# Altium schematic symbol library jlcpcb_2025_04_capacitors_extended_0805.schlib: 3281 symbols (part 16 of 18) (continued)
## NL0805B104M500CPBN
designator C?  Capacitance: 100nF  (hidden comment: *)
Capacitor, Ceramic (MLCC), 100nF, ±20%, 50V, X7R, ±20%, SMD 0805; Manufacturer: HUI JU; Manufacturer Part Number: NL0805B104M500CPBN; Package Size: 0805; JLCPCB Basic Part: No; JLCPCB Part Number: C720961; Supplier 1: LCSC; Category: Capacitors - MLCC; Supplier Part Number 1: C720961; Tolerance: ±20%; Voltage Rating: 50V; Temperature Coefficient: X7R; RoHS: Yes; ComponentLink1Description: Datasheet; ComponentLink1URL: https://wmsc.lcsc.com/wmsc/upload/file/pdf/v2/lcsc/2304140030_HUI-JU-NL0805B104M500CPBN_C720961.pdf; ComponentLink2Description: JLCPCB Part URL; ComponentLink2URL: https://jlcpcb.com/partdetail/C720961; ComponentLink3Description: LCSC Part URL; ComponentLink3URL: https://lcsc.com/product-detail/Multilayer-Ceramic-Capacitors-MLCC---SMD-SMT_HUI-JU-HUI-JU-NL0805B104M500CPBN_C720961.html
footprint CAP-0805 (0805 (2012M) Capacitor)
pins: 1, 2

## NL0805B122K500CPBN
designator C?  Capacitance: 1.2nF  (hidden comment: *)
Capacitor, Ceramic (MLCC), 1.2nF, ±10%, 50V, X7R, ±10%, SMD 0805; Manufacturer: HUI JU; Manufacturer Part Number: NL0805B122K500CPBN; Package Size: 0805; JLCPCB Basic Part: No; JLCPCB Part Number: C2961024; Supplier 1: LCSC; Category: Capacitors - MLCC; Supplier Part Number 1: C2961024; Tolerance: ±10%; Voltage Rating: 50V; Temperature Coefficient: X7R; RoHS: Yes; ComponentLink1Description: Datasheet; ComponentLink1URL: https://wmsc.lcsc.com/wmsc/upload/file/pdf/v2/lcsc/2201141700_HUI-JU-NL0805B122K500CPBN_C2961024.pdf; ComponentLink2Description: JLCPCB Part URL; ComponentLink2URL: https://jlcpcb.com/partdetail/C2961024; ComponentLink3Description: LCSC Part URL; ComponentLink3URL: https://lcsc.com/product-detail/Multilayer-Ceramic-Capacitors-MLCC---SMD-SMT_HUI-JU-HUI-JU-NL0805B122K500CPBN_C2961024.html
footprint CAP-0805 (0805 (2012M) Capacitor)
pins: 1, 2

## NL0805B124K500CEDN
designator C?  Capacitance: 120nF  (hidden comment: *)
Capacitor, Ceramic (MLCC), 120nF, ±10%, 50V, X7R, ±10%, SMD 0805; Manufacturer: HUI JU; Manufacturer Part Number: NL0805B124K500CEDN; Package Size: 0805; JLCPCB Basic Part: No; JLCPCB Part Number: C725799; Supplier 1: LCSC; Category: Capacitors - MLCC; Supplier Part Number 1: C725799; Tolerance: ±10%; Voltage Rating: 50V; Temperature Coefficient: X7R; RoHS: Yes; ComponentLink1Description: Datasheet; ComponentLink1URL: https://wmsc.lcsc.com/wmsc/upload/file/pdf/v2/lcsc/2304140030_HUI-JU-NL0805B124K500CEDN_C725799.pdf; ComponentLink2Description: JLCPCB Part URL; ComponentLink2URL: https://jlcpcb.com/partdetail/C725799; ComponentLink3Description: LCSC Part URL; ComponentLink3URL: https://lcsc.com/product-detail/Multilayer-Ceramic-Capacitors-MLCC---SMD-SMT_HUI-JU-HUI-JU-NL0805B124K500CEDN_C725799.html
footprint CAP-0805 (0805 (2012M) Capacitor)
pins: 1, 2

## NL0805B124K500CPBN
designator C?  Capacitance: 120nF  (hidden comment: *)
Capacitor, Ceramic (MLCC), 120nF, ±10%, 50V, ±10%, SMD 0805; Manufacturer: HUI JU; Manufacturer Part Number: NL0805B124K500CPBN; Package Size: 0805; JLCPCB Basic Part: No; JLCPCB Part Number: C2835176; Supplier 1: LCSC; Category: Capacitors - MLCC; Supplier Part Number 1: C2835176; Tolerance: ±10%; Voltage Rating: 50V; RoHS: Yes; ComponentLink1Description: Datasheet; ComponentLink1URL: https://wmsc.lcsc.com/wmsc/upload/file/pdf/v2/lcsc/2304140030_HUI-JU-NL0805B124K500CPBN_C2835176.pdf; ComponentLink2Description: JLCPCB Part URL; ComponentLink2URL: https://jlcpcb.com/partdetail/C2835176; ComponentLink3Description: LCSC Part URL; ComponentLink3URL: https://lcsc.com/product-detail/Multilayer-Ceramic-Capacitors-MLCC---SMD-SMT_HUI-JU-HUI-JU-NL0805B124K500CPBN_C2835176.html
footprint CAP-0805 (0805 (2012M) Capacitor)
pins: 1, 2

## NL0805B152K500CPBN
designator C?  Capacitance: 1.5nF  (hidden comment: *)
Capacitor, Ceramic (MLCC), 1.5nF, ±10%, 50V, ±10%, SMD 0805; Manufacturer: HUI JU; Manufacturer Part Number: NL0805B152K500CPBN; Package Size: 0805; JLCPCB Basic Part: No; JLCPCB Part Number: C841541; Supplier 1: LCSC; Category: Capacitors - MLCC; Supplier Part Number 1: C841541; Tolerance: ±10%; Voltage Rating: 50V; RoHS: Yes; ComponentLink1Description: Datasheet; ComponentLink1URL: https://wmsc.lcsc.com/wmsc/upload/file/pdf/v2/lcsc/2304140030_HUI-JU-NL0805B152K500CPBN_C841541.pdf; ComponentLink2Description: JLCPCB Part URL; ComponentLink2URL: https://jlcpcb.com/partdetail/C841541; ComponentLink3Description: LCSC Part URL; ComponentLink3URL: https://lcsc.com/product-detail/Multilayer-Ceramic-Capacitors-MLCC---SMD-SMT_HUI-JU-HUI-JU-NL0805B152K500CPBN_C841541.html
footprint CAP-0805 (0805 (2012M) Capacitor)
pins: 1, 2

## NL0805B182K500CPBN
designator C?  Capacitance: 1.8nF  (hidden comment: *)
Capacitor, Ceramic (MLCC), 1.8nF, 50V, SMD 0805; Manufacturer: HUI JU; Manufacturer Part Number: NL0805B182K500CPBN; Package Size: 0805; JLCPCB Basic Part: No; JLCPCB Part Number: C2835171; Supplier 1: LCSC; Category: Capacitors - MLCC; Supplier Part Number 1: C2835171; Voltage Rating: 50V; RoHS: Yes; ComponentLink1Description: Datasheet; ComponentLink1URL: https://wmsc.lcsc.com/wmsc/upload/file/pdf/v2/lcsc/2304140030_HUI-JU-NL0805B182K500CPBN_C2835171.pdf; ComponentLink2Description: JLCPCB Part URL; ComponentLink2URL: https://jlcpcb.com/partdetail/C2835171; ComponentLink3Description: LCSC Part URL; ComponentLink3URL: https://lcsc.com/product-detail/Multilayer-Ceramic-Capacitors-MLCC---SMD-SMT_HUI-JU-HUI-JU-NL0805B182K500CPBN_C2835171.html
footprint CAP-0805 (0805 (2012M) Capacitor)
pins: 1, 2

## NL0805B184K500CEDN
designator C?  Capacitance: 180nF  (hidden comment: *)
Capacitor, Ceramic (MLCC), 180nF, ±10%, 50V, X7R, ±10%, SMD 0805; Manufacturer: HUI JU; Manufacturer Part Number: NL0805B184K500CEDN; Package Size: 0805; JLCPCB Basic Part: No; JLCPCB Part Number: C720964; Supplier 1: LCSC; Category: Capacitors - MLCC; Supplier Part Number 1: C720964; Tolerance: ±10%; Voltage Rating: 50V; Temperature Coefficient: X7R; RoHS: Yes; ComponentLink1Description: Datasheet; ComponentLink1URL: https://wmsc.lcsc.com/wmsc/upload/file/pdf/v2/lcsc/2304140030_HUI-JU-NL0805B184K500CEDN_C720964.pdf; ComponentLink2Description: JLCPCB Part URL; ComponentLink2URL: https://jlcpcb.com/partdetail/C720964; ComponentLink3Description: LCSC Part URL; ComponentLink3URL: https://lcsc.com/product-detail/Multilayer-Ceramic-Capacitors-MLCC---SMD-SMT_HUI-JU-HUI-JU-NL0805B184K500CEDN_C720964.html
footprint CAP-0805 (0805 (2012M) Capacitor)
pins: 1, 2

## NL0805B204K500CPBN
designator C?  Capacitance: 200nF  (hidden comment: *)
Capacitor, Ceramic (MLCC), 200nF, ±10%, 50V, ±10%, SMD 0805; Manufacturer: HUI JU; Manufacturer Part Number: NL0805B204K500CPBN; Package Size: 0805; JLCPCB Basic Part: No; JLCPCB Part Number: C918135; Supplier 1: LCSC; Category: Capacitors - MLCC; Supplier Part Number 1: C918135; Tolerance: ±10%; Voltage Rating: 50V; RoHS: Yes; ComponentLink1Description: Datasheet; ComponentLink1URL: https://wmsc.lcsc.com/wmsc/upload/file/pdf/v2/lcsc/2304140030_HUI-JU-NL0805B204K500CPBN_C918135.pdf; ComponentLink2Description: JLCPCB Part URL; ComponentLink2URL: https://jlcpcb.com/partdetail/C918135; ComponentLink3Description: LCSC Part URL; ComponentLink3URL: https://lcsc.com/product-detail/Multilayer-Ceramic-Capacitors-MLCC---SMD-SMT_HUI-JU-HUI-JU-NL0805B204K500CPBN_C918135.html
footprint CAP-0805 (0805 (2012M) Capacitor)
pins: 1, 2

## NL0805B223K500CPBN
designator C?  Capacitance: 22nF  (hidden comment: *)
Capacitor, Ceramic (MLCC), 22nF, ±10%, 50V, ±10%, SMD 0805; Manufacturer: HUI JU; Manufacturer Part Number: NL0805B223K500CPBN; Package Size: 0805; JLCPCB Basic Part: No; JLCPCB Part Number: C969994; Supplier 1: LCSC; Category: Capacitors - MLCC; Supplier Part Number 1: C969994; Tolerance: ±10%; Voltage Rating: 50V; RoHS: Yes; ComponentLink1Description: Datasheet; ComponentLink1URL: https://wmsc.lcsc.com/wmsc/upload/file/pdf/v2/lcsc/2304140030_HUI-JU-NL0805B223K500CPBN_C969994.pdf; ComponentLink2Description: JLCPCB Part URL; ComponentLink2URL: https://jlcpcb.com/partdetail/C969994; ComponentLink3Description: LCSC Part URL; ComponentLink3URL: https://lcsc.com/product-detail/Multilayer-Ceramic-Capacitors-MLCC---SMD-SMT_HUI-JU-HUI-JU-NL0805B223K500CPBN_C969994.html
footprint CAP-0805 (0805 (2012M) Capacitor)
pins: 1, 2

## NL0805B223M500CPBN
designator C?  Capacitance: 22nF  (hidden comment: *)
Capacitor, Ceramic (MLCC), 22nF, ±20%, 50V, ±20%, SMD 0805; Manufacturer: HUI JU; Manufacturer Part Number: NL0805B223M500CPBN; Package Size: 0805; JLCPCB Basic Part: No; JLCPCB Part Number: C969995; Supplier 1: LCSC; Category: Capacitors - MLCC; Supplier Part Number 1: C969995; Tolerance: ±20%; Voltage Rating: 50V; RoHS: Yes; ComponentLink1Description: Datasheet; ComponentLink1URL: https://wmsc.lcsc.com/wmsc/upload/file/pdf/v2/lcsc/2304140030_HUI-JU-NL0805B223M500CPBN_C969995.pdf; ComponentLink2Description: JLCPCB Part URL; ComponentLink2URL: https://jlcpcb.com/partdetail/C969995; ComponentLink3Description: LCSC Part URL; ComponentLink3URL: https://lcsc.com/product-detail/Multilayer-Ceramic-Capacitors-MLCC---SMD-SMT_HUI-JU-HUI-JU-NL0805B223M500CPBN_C969995.html
footprint CAP-0805 (0805 (2012M) Capacitor)
pins: 1, 2

## NL0805B224K500CEDN
designator C?  Capacitance: 220nF  (hidden comment: *)
Capacitor, Ceramic (MLCC), 220nF, ±10%, 50V, X7R, ±10%, SMD 0805; Manufacturer: HUI JU; Manufacturer Part Number: NL0805B224K500CEDN; Package Size: 0805; JLCPCB Basic Part: No; JLCPCB Part Number: C2843471; Supplier 1: LCSC; Category: Capacitors - MLCC; Supplier Part Number 1: C2843471; Tolerance: ±10%; Voltage Rating: 50V; Temperature Coefficient: X7R; RoHS: Yes; ComponentLink1Description: Datasheet; ComponentLink1URL: https://wmsc.lcsc.com/wmsc/upload/file/pdf/v2/lcsc/2201201730_HUI-JU-NL0805B224K500CEDN_C2843471.pdf; ComponentLink2Description: JLCPCB Part URL; ComponentLink2URL: https://jlcpcb.com/partdetail/C2843471; ComponentLink3Description: LCSC Part URL; ComponentLink3URL: https://lcsc.com/product-detail/Multilayer-Ceramic-Capacitors-MLCC---SMD-SMT_HUI-JU-HUI-JU-NL0805B224K500CEDN_C2843471.html
footprint CAP-0805 (0805 (2012M) Capacitor)
pins: 1, 2

## NL0805B224K500CPBN
designator C?  Capacitance: 220nF  (hidden comment: *)
Capacitor, Ceramic (MLCC), 220nF, ±10%, 50V, ±10%, SMD 0805; Manufacturer: HUI JU; Manufacturer Part Number: NL0805B224K500CPBN; Package Size: 0805; JLCPCB Basic Part: No; JLCPCB Part Number: C780699; Supplier 1: LCSC; Category: Capacitors - MLCC; Supplier Part Number 1: C780699; Tolerance: ±10%; Voltage Rating: 50V; RoHS: Yes; ComponentLink1Description: Datasheet; ComponentLink1URL: https://wmsc.lcsc.com/wmsc/upload/file/pdf/v2/lcsc/2304140030_HUI-JU-NL0805B224K500CPBN_C780699.pdf; ComponentLink2Description: JLCPCB Part URL; ComponentLink2URL: https://jlcpcb.com/partdetail/C780699; ComponentLink3Description: LCSC Part URL; ComponentLink3URL: https://lcsc.com/product-detail/Multilayer-Ceramic-Capacitors-MLCC---SMD-SMT_HUI-JU-HUI-JU-NL0805B224K500CPBN_C780699.html
footprint CAP-0805 (0805 (2012M) Capacitor)
pins: 1, 2

## NL0805B224M500CPBN
designator C?  Capacitance: 220nF  (hidden comment: *)
Capacitor, Ceramic (MLCC), 220nF, ±20%, 50V, ±20%, SMD 0805; Manufacturer: HUI JU; Manufacturer Part Number: NL0805B224M500CPBN; Package Size: 0805; JLCPCB Basic Part: No; JLCPCB Part Number: C2760334; Supplier 1: LCSC; Category: Capacitors - MLCC; Supplier Part Number 1: C2760334; Tolerance: ±20%; Voltage Rating: 50V; RoHS: Yes; ComponentLink1Description: Datasheet; ComponentLink1URL: https://wmsc.lcsc.com/wmsc/upload/file/pdf/v2/lcsc/2304140030_HUI-JU-NL0805B224M500CPBN_C2760334.pdf; ComponentLink2Description: JLCPCB Part URL; ComponentLink2URL: https://jlcpcb.com/partdetail/C2760334; ComponentLink3Description: LCSC Part URL; ComponentLink3URL: https://lcsc.com/product-detail/Multilayer-Ceramic-Capacitors-MLCC---SMD-SMT_HUI-JU-HUI-JU-NL0805B224M500CPBN_C2760334.html
footprint CAP-0805 (0805 (2012M) Capacitor)
pins: 1, 2

## NL0805B272K500CPBN
designator C?  Capacitance: 2.7nF  (hidden comment: *)
Capacitor, Ceramic (MLCC), 2.7nF, ±10%, 50V, X7R, ±10%, SMD 0805; Manufacturer: HUI JU; Manufacturer Part Number: NL0805B272K500CPBN; Package Size: 0805; JLCPCB Basic Part: No; JLCPCB Part Number: C2961025; Supplier 1: LCSC; Category: Capacitors - MLCC; Supplier Part Number 1: C2961025; Tolerance: ±10%; Voltage Rating: 50V; Temperature Coefficient: X7R; RoHS: Yes; ComponentLink1Description: Datasheet; ComponentLink1URL: https://wmsc.lcsc.com/wmsc/upload/file/pdf/v2/lcsc/2201141700_HUI-JU-NL0805B272K500CPBN_C2961025.pdf; ComponentLink2Description: JLCPCB Part URL; ComponentLink2URL: https://jlcpcb.com/partdetail/C2961025; ComponentLink3Description: LCSC Part URL; ComponentLink3URL: https://lcsc.com/product-detail/Multilayer-Ceramic-Capacitors-MLCC---SMD-SMT_HUI-JU-HUI-JU-NL0805B272K500CPBN_C2961025.html
footprint CAP-0805 (0805 (2012M) Capacitor)
pins: 1, 2

## NL0805B274K500CEDN
designator C?  Capacitance: 270nF  (hidden comment: *)
Capacitor, Ceramic (MLCC), 270nF, ±10%, 50V, ±10%, SMD 0805; Manufacturer: HUI JU; Manufacturer Part Number: NL0805B274K500CEDN; Package Size: 0805; JLCPCB Basic Part: No; JLCPCB Part Number: C841543; Supplier 1: LCSC; Category: Capacitors - MLCC; Supplier Part Number 1: C841543; Tolerance: ±10%; Voltage Rating: 50V; RoHS: Yes; ComponentLink1Description: Datasheet; ComponentLink1URL: https://wmsc.lcsc.com/wmsc/upload/file/pdf/v2/lcsc/2304140030_HUI-JU-NL0805B274K500CEDN_C841543.pdf; ComponentLink2Description: JLCPCB Part URL; ComponentLink2URL: https://jlcpcb.com/partdetail/C841543; ComponentLink3Description: LCSC Part URL; ComponentLink3URL: https://lcsc.com/product-detail/Multilayer-Ceramic-Capacitors-MLCC---SMD-SMT_HUI-JU-HUI-JU-NL0805B274K500CEDN_C841543.html
footprint CAP-0805 (0805 (2012M) Capacitor)
pins: 1, 2

## NL0805B331K500CPBN
designator C?  Capacitance: 330pF  (hidden comment: *)
Capacitor, Ceramic (MLCC), 330pF, ±10%, 50V, ±10%, SMD 0805; Manufacturer: HUI JU; Manufacturer Part Number: NL0805B331K500CPBN; Package Size: 0805; JLCPCB Basic Part: No; JLCPCB Part Number: C841544; Supplier 1: LCSC; Category: Capacitors - MLCC; Supplier Part Number 1: C841544; Tolerance: ±10%; Voltage Rating: 50V; RoHS: Yes; ComponentLink1Description: Datasheet; ComponentLink1URL: https://wmsc.lcsc.com/wmsc/upload/file/pdf/v2/lcsc/2304140030_HUI-JU-NL0805B331K500CPBN_C841544.pdf; ComponentLink2Description: JLCPCB Part URL; ComponentLink2URL: https://jlcpcb.com/partdetail/C841544; ComponentLink3Description: LCSC Part URL; ComponentLink3URL: https://lcsc.com/product-detail/Multilayer-Ceramic-Capacitors-MLCC---SMD-SMT_HUI-JU-HUI-JU-NL0805B331K500CPBN_C841544.html
footprint CAP-0805 (0805 (2012M) Capacitor)
pins: 1, 2

## NL0805B332K500CPBN
designator C?  Capacitance: 3.3nF  (hidden comment: *)
Capacitor, Ceramic (MLCC), 3.3nF, ±10%, 50V, ±10%, SMD 0805; Manufacturer: HUI JU; Manufacturer Part Number: NL0805B332K500CPBN; Package Size: 0805; JLCPCB Basic Part: No; JLCPCB Part Number: C2760340; Supplier 1: LCSC; Category: Capacitors - MLCC; Supplier Part Number 1: C2760340; Tolerance: ±10%; Voltage Rating: 50V; RoHS: Yes; ComponentLink1Description: Datasheet; ComponentLink1URL: https://wmsc.lcsc.com/wmsc/upload/file/pdf/v2/lcsc/2304140030_HUI-JU-NL0805B332K500CPBN_C2760340.pdf; ComponentLink2Description: JLCPCB Part URL; ComponentLink2URL: https://jlcpcb.com/partdetail/C2760340; ComponentLink3Description: LCSC Part URL; ComponentLink3URL: https://lcsc.com/product-detail/Multilayer-Ceramic-Capacitors-MLCC---SMD-SMT_HUI-JU-HUI-JU-NL0805B332K500CPBN_C2760340.html
footprint CAP-0805 (0805 (2012M) Capacitor)
pins: 1, 2

## NL0805B333K500CPBN
designator C?  Capacitance: 33nF  (hidden comment: *)
Capacitor, Ceramic (MLCC), 33nF, 50V, SMD 0805; Manufacturer: HUI JU; Manufacturer Part Number: NL0805B333K500CPBN; Package Size: 0805; JLCPCB Basic Part: No; JLCPCB Part Number: C2760337; Supplier 1: LCSC; Category: Capacitors - MLCC; Supplier Part Number 1: C2760337; Voltage Rating: 50V; RoHS: Yes; ComponentLink1Description: Datasheet; ComponentLink1URL: https://wmsc.lcsc.com/wmsc/upload/file/pdf/v2/lcsc/2304140030_HUI-JU-NL0805B333K500CPBN_C2760337.pdf; ComponentLink2Description: JLCPCB Part URL; ComponentLink2URL: https://jlcpcb.com/partdetail/C2760337; ComponentLink3Description: LCSC Part URL; ComponentLink3URL: https://lcsc.com/product-detail/Multilayer-Ceramic-Capacitors-MLCC---SMD-SMT_HUI-JU-HUI-JU-NL0805B333K500CPBN_C2760337.html
footprint CAP-0805 (0805 (2012M) Capacitor)
pins: 1, 2

## NL0805B334K500CPBN
designator C?  Capacitance: 330nF  (hidden comment: *)
Capacitor, Ceramic (MLCC), 330nF, ±10%, 50V, X7R, ±10%, SMD 0805; Manufacturer: HUI JU; Manufacturer Part Number: NL0805B334K500CPBN; Package Size: 0805; JLCPCB Basic Part: No; JLCPCB Part Number: C2961026; Supplier 1: LCSC; Category: Capacitors - MLCC; Supplier Part Number 1: C2961026; Tolerance: ±10%; Voltage Rating: 50V; Temperature Coefficient: X7R; RoHS: Yes; ComponentLink1Description: Datasheet; ComponentLink1URL: https://wmsc.lcsc.com/wmsc/upload/file/pdf/v2/lcsc/2201141700_HUI-JU-NL0805B334K500CPBN_C2961026.pdf; ComponentLink2Description: JLCPCB Part URL; ComponentLink2URL: https://jlcpcb.com/partdetail/C2961026; ComponentLink3Description: LCSC Part URL; ComponentLink3URL: https://lcsc.com/product-detail/Multilayer-Ceramic-Capacitors-MLCC---SMD-SMT_HUI-JU-HUI-JU-NL0805B334K500CPBN_C2961026.html
footprint CAP-0805 (0805 (2012M) Capacitor)
pins: 1, 2

## NL0805B392K500CPBN
designator C?  Capacitance: 3.9nF  (hidden comment: *)
Capacitor, Ceramic (MLCC), 3.9nF, 50V, X7R, SMD 0805; Manufacturer: HUI JU; Manufacturer Part Number: NL0805B392K500CPBN; Package Size: 0805; JLCPCB Basic Part: No; JLCPCB Part Number: C2961027; Supplier 1: LCSC; Category: Capacitors - MLCC; Supplier Part Number 1: C2961027; Voltage Rating: 50V; Temperature Coefficient: X7R; RoHS: Yes; ComponentLink1Description: Datasheet; ComponentLink1URL: https://wmsc.lcsc.com/wmsc/upload/file/pdf/v2/lcsc/2201141700_HUI-JU-NL0805B392K500CPBN_C2961027.pdf; ComponentLink2Description: JLCPCB Part URL; ComponentLink2URL: https://jlcpcb.com/partdetail/C2961027; ComponentLink3Description: LCSC Part URL; ComponentLink3URL: https://lcsc.com/product-detail/Multilayer-Ceramic-Capacitors-MLCC---SMD-SMT_HUI-JU-HUI-JU-NL0805B392K500CPBN_C2961027.html
footprint CAP-0805 (0805 (2012M) Capacitor)
pins: 1, 2

## NL0805B472K500CPBN
designator C?  Capacitance: 4.7nF  (hidden comment: *)
Capacitor, Ceramic (MLCC), 4.7nF, ±10%, 50V, X7R, ±10%, SMD 0805; Manufacturer: HUI JU; Manufacturer Part Number: NL0805B472K500CPBN; Package Size: 0805; JLCPCB Basic Part: No; JLCPCB Part Number: C717014; Supplier 1: LCSC; Category: Capacitors - MLCC; Supplier Part Number 1: C717014; Tolerance: ±10%; Voltage Rating: 50V; Temperature Coefficient: X7R; RoHS: Yes; ComponentLink1Description: Datasheet; ComponentLink1URL: https://wmsc.lcsc.com/wmsc/upload/file/pdf/v2/lcsc/2304140030_HUI-JU-NL0805B472K500CPBN_C717014.pdf; ComponentLink2Description: JLCPCB Part URL; ComponentLink2URL: https://jlcpcb.com/partdetail/C717014; ComponentLink3Description: LCSC Part URL; ComponentLink3URL: https://lcsc.com/product-detail/Multilayer-Ceramic-Capacitors-MLCC---SMD-SMT_HUI-JU-HUI-JU-NL0805B472K500CPBN_C717014.html
footprint CAP-0805 (0805 (2012M) Capacitor)
pins: 1, 2

## NL0805B473K500CPBN
designator C?  Capacitance: 47nF  (hidden comment: *)
Capacitor, Ceramic (MLCC), 47nF, ±10%, 50V, ±10%, SMD 0805; Manufacturer: HUI JU; Manufacturer Part Number: NL0805B473K500CPBN; Package Size: 0805; JLCPCB Basic Part: No; JLCPCB Part Number: C841546; Supplier 1: LCSC; Category: Capacitors - MLCC; Supplier Part Number 1: C841546; Tolerance: ±10%; Voltage Rating: 50V; RoHS: Yes; ComponentLink1Description: Datasheet; ComponentLink1URL: https://wmsc.lcsc.com/wmsc/upload/file/pdf/v2/lcsc/2304140030_HUI-JU-NL0805B473K500CPBN_C841546.pdf; ComponentLink2Description: JLCPCB Part URL; ComponentLink2URL: https://jlcpcb.com/partdetail/C841546; ComponentLink3Description: LCSC Part URL; ComponentLink3URL: https://lcsc.com/product-detail/Multilayer-Ceramic-Capacitors-MLCC---SMD-SMT_HUI-JU-HUI-JU-NL0805B473K500CPBN_C841546.html
footprint CAP-0805 (0805 (2012M) Capacitor)
pins: 1, 2

## NL0805B474K500CEIN
designator C?  Capacitance: 470nF  (hidden comment: *)
Capacitor, Ceramic (MLCC), 470nF, ±10%, 50V, ±10%, SMD 0805; Manufacturer: HUI JU; Manufacturer Part Number: NL0805B474K500CEIN; Package Size: 0805; JLCPCB Basic Part: No; JLCPCB Part Number: C841548; Supplier 1: LCSC; Category: Capacitors - MLCC; Supplier Part Number 1: C841548; Tolerance: ±10%; Voltage Rating: 50V; RoHS: Yes; ComponentLink1Description: Datasheet; ComponentLink1URL: https://wmsc.lcsc.com/wmsc/upload/file/pdf/v2/lcsc/2304140030_HUI-JU-NL0805B474K500CEIN_C841548.pdf; ComponentLink2Description: JLCPCB Part URL; ComponentLink2URL: https://jlcpcb.com/partdetail/C841548; ComponentLink3Description: LCSC Part URL; ComponentLink3URL: https://lcsc.com/product-detail/Multilayer-Ceramic-Capacitors-MLCC---SMD-SMT_HUI-JU-HUI-JU-NL0805B474K500CEIN_C841548.html
footprint CAP-0805 (0805 (2012M) Capacitor)
pins: 1, 2

## NL0805B474K500CPBN
designator C?  Capacitance: 470nF  (hidden comment: *)
Capacitor, Ceramic (MLCC), 470nF, 50V, SMD 0805; Manufacturer: HUI JU; Manufacturer Part Number: NL0805B474K500CPBN; Package Size: 0805; JLCPCB Basic Part: No; JLCPCB Part Number: C2835172; Supplier 1: LCSC; Category: Capacitors - MLCC; Supplier Part Number 1: C2835172; Voltage Rating: 50V; RoHS: Yes; ComponentLink1Description: Datasheet; ComponentLink1URL: https://wmsc.lcsc.com/wmsc/upload/file/pdf/v2/lcsc/2304140030_HUI-JU-NL0805B474K500CPBN_C2835172.pdf; ComponentLink2Description: JLCPCB Part URL; ComponentLink2URL: https://jlcpcb.com/partdetail/C2835172; ComponentLink3Description: LCSC Part URL; ComponentLink3URL: https://lcsc.com/product-detail/Multilayer-Ceramic-Capacitors-MLCC---SMD-SMT_HUI-JU-HUI-JU-NL0805B474K500CPBN_C2835172.html
footprint CAP-0805 (0805 (2012M) Capacitor)
pins: 1, 2

## NL0805B682K500CPBN
designator C?  Capacitance: 6.8nF  (hidden comment: *)
Capacitor, Ceramic (MLCC), 6.8nF, ±10%, 50V, ±10%, SMD 0805; Manufacturer: HUI JU; Manufacturer Part Number: NL0805B682K500CPBN; Package Size: 0805; JLCPCB Basic Part: No; JLCPCB Part Number: C918136; Supplier 1: LCSC; Category: Capacitors - MLCC; Supplier Part Number 1: C918136; Tolerance: ±10%; Voltage Rating: 50V; RoHS: Yes; ComponentLink1Description: Datasheet; ComponentLink1URL: https://wmsc.lcsc.com/wmsc/upload/file/pdf/v2/lcsc/2304140030_HUI-JU-NL0805B682K500CPBN_C918136.pdf; ComponentLink2Description: JLCPCB Part URL; ComponentLink2URL: https://jlcpcb.com/partdetail/C918136; ComponentLink3Description: LCSC Part URL; ComponentLink3URL: https://lcsc.com/product-detail/Multilayer-Ceramic-Capacitors-MLCC---SMD-SMT_HUI-JU-HUI-JU-NL0805B682K500CPBN_C918136.html
footprint CAP-0805 (0805 (2012M) Capacitor)
pins: 1, 2

## NL0805B684K500CEIN
designator C?  Capacitance: 680nF  (hidden comment: *)
Capacitor, Ceramic (MLCC), 680nF, ±10%, 50V, ±10%, SMD 0805; Manufacturer: HUI JU; Manufacturer Part Number: NL0805B684K500CEIN; Package Size: 0805; JLCPCB Basic Part: No; JLCPCB Part Number: C841550; Supplier 1: LCSC; Category: Capacitors - MLCC; Supplier Part Number 1: C841550; Tolerance: ±10%; Voltage Rating: 50V; RoHS: Yes; ComponentLink1Description: Datasheet; ComponentLink1URL: https://wmsc.lcsc.com/wmsc/upload/file/pdf/v2/lcsc/2304140030_HUI-JU-NL0805B684K500CEIN_C841550.pdf; ComponentLink2Description: JLCPCB Part URL; ComponentLink2URL: https://jlcpcb.com/partdetail/C841550; ComponentLink3Description: LCSC Part URL; ComponentLink3URL: https://lcsc.com/product-detail/Multilayer-Ceramic-Capacitors-MLCC---SMD-SMT_HUI-JU-HUI-JU-NL0805B684K500CEIN_C841550.html
footprint CAP-0805 (0805 (2012M) Capacitor)
pins: 1, 2

## NL0805B822K500CPBN
designator C?  Capacitance: 8.2nF  (hidden comment: *)
Capacitor, Ceramic (MLCC), 8.2nF, 50V, X7R, SMD 0805; Manufacturer: HUI JU; Manufacturer Part Number: NL0805B822K500CPBN; Package Size: 0805; JLCPCB Basic Part: No; JLCPCB Part Number: C2961028; Supplier 1: LCSC; Category: Capacitors - MLCC; Supplier Part Number 1: C2961028; Voltage Rating: 50V; Temperature Coefficient: X7R; RoHS: Yes; ComponentLink1Description: Datasheet; ComponentLink1URL: https://wmsc.lcsc.com/wmsc/upload/file/pdf/v2/lcsc/2201141700_HUI-JU-NL0805B822K500CPBN_C2961028.pdf; ComponentLink2Description: JLCPCB Part URL; ComponentLink2URL: https://jlcpcb.com/partdetail/C2961028; ComponentLink3Description: LCSC Part URL; ComponentLink3URL: https://lcsc.com/product-detail/Multilayer-Ceramic-Capacitors-MLCC---SMD-SMT_HUI-JU-HUI-JU-NL0805B822K500CPBN_C2961028.html
footprint CAP-0805 (0805 (2012M) Capacitor)
pins: 1, 2

## NM0805B102K101CPBN
designator C?  Capacitance: 1nF  (hidden comment: *)
Capacitor, Ceramic (MLCC), 1nF, ±10%, 100V, ±10%, SMD 0805; Manufacturer: HUI JU; Manufacturer Part Number: NM0805B102K101CPBN; Package Size: 0805; JLCPCB Basic Part: No; JLCPCB Part Number: C780689; Supplier 1: LCSC; Category: Capacitors - MLCC; Supplier Part Number 1: C780689; Tolerance: ±10%; Voltage Rating: 100V; RoHS: Yes; ComponentLink1Description: Datasheet; ComponentLink1URL: https://wmsc.lcsc.com/wmsc/upload/file/pdf/v2/lcsc/2304140030_HUI-JU-NM0805B102K101CPBN_C780689.pdf; ComponentLink2Description: JLCPCB Part URL; ComponentLink2URL: https://jlcpcb.com/partdetail/C780689; ComponentLink3Description: LCSC Part URL; ComponentLink3URL: https://lcsc.com/product-detail/Multilayer-Ceramic-Capacitors-MLCC---SMD-SMT_HUI-JU-HUI-JU-NM0805B102K101CPBN_C780689.html
footprint CAP-0805 (0805 (2012M) Capacitor)
pins: 1, 2

## NM0805B102K251CPBN
designator C?  Capacitance: 1nF  (hidden comment: *)
Capacitor, Ceramic (MLCC), 1nF, ±10%, 250V, X7R, ±10%, SMD 0805; Manufacturer: HUI JU; Manufacturer Part Number: NM0805B102K251CPBN; Package Size: 0805; JLCPCB Basic Part: No; JLCPCB Part Number: C717013; Supplier 1: LCSC; Category: Capacitors - MLCC; Supplier Part Number 1: C717013; Tolerance: ±10%; Voltage Rating: 250V; Temperature Coefficient: X7R; RoHS: Yes; ComponentLink1Description: Datasheet; ComponentLink1URL: https://wmsc.lcsc.com/wmsc/upload/file/pdf/v2/lcsc/2304140030_HUI-JU-NM0805B102K251CPBN_C717013.pdf; ComponentLink2Description: JLCPCB Part URL; ComponentLink2URL: https://jlcpcb.com/partdetail/C717013; ComponentLink3Description: LCSC Part URL; ComponentLink3URL: https://lcsc.com/product-detail/Multilayer-Ceramic-Capacitors-MLCC---SMD-SMT_HUI-JU-HUI-JU-NM0805B102K251CPBN_C717013.html
footprint CAP-0805 (0805 (2012M) Capacitor)
pins: 1, 2

## NM0805B102K501CPBN
designator C?  Capacitance: 1nF  (hidden comment: *)
Capacitor, Ceramic (MLCC), 1nF, ±10%, 500V, X7R, ±10%, SMD 0805; Manufacturer: HUI JU; Manufacturer Part Number: NM0805B102K501CPBN; Package Size: 0805; JLCPCB Basic Part: No; JLCPCB Part Number: C784422; Supplier 1: LCSC; Category: Capacitors - MLCC; Supplier Part Number 1: C784422; Tolerance: ±10%; Voltage Rating: 500V; Temperature Coefficient: X7R; RoHS: Yes; ComponentLink1Description: Datasheet; ComponentLink1URL: https://wmsc.lcsc.com/wmsc/upload/file/pdf/v2/lcsc/2304140030_HUI-JU-NM0805B102K501CPBN_C784422.pdf; ComponentLink2Description: JLCPCB Part URL; ComponentLink2URL: https://jlcpcb.com/partdetail/C784422; ComponentLink3Description: LCSC Part URL; ComponentLink3URL: https://lcsc.com/product-detail/Multilayer-Ceramic-Capacitors-MLCC---SMD-SMT_HUI-JU-HUI-JU-NM0805B102K501CPBN_C784422.html
footprint CAP-0805 (0805 (2012M) Capacitor)
pins: 1, 2

## NM0805B103K251CEDN
designator C?  Capacitance: 10nF  (hidden comment: *)
Capacitor, Ceramic (MLCC), 10nF, ±10%, 250V, X7R, ±10%, SMD 0805; Manufacturer: HUI JU; Manufacturer Part Number: NM0805B103K251CEDN; Package Size: 0805; JLCPCB Basic Part: No; JLCPCB Part Number: C710455; Supplier 1: LCSC; Category: Capacitors - MLCC; Supplier Part Number 1: C710455; Tolerance: ±10%; Voltage Rating: 250V; Temperature Coefficient: X7R; RoHS: Yes; ComponentLink1Description: Datasheet; ComponentLink1URL: https://wmsc.lcsc.com/wmsc/upload/file/pdf/v2/lcsc/2304140030_HUI-JU-NM0805B103K251CEDN_C710455.pdf; ComponentLink2Description: JLCPCB Part URL; ComponentLink2URL: https://jlcpcb.com/partdetail/C710455; ComponentLink3Description: LCSC Part URL; ComponentLink3URL: https://lcsc.com/product-detail/Multilayer-Ceramic-Capacitors-MLCC---SMD-SMT_HUI-JU-HUI-JU-NM0805B103K251CEDN_C710455.html
footprint CAP-0805 (0805 (2012M) Capacitor)
pins: 1, 2

## NM0805B103K631CEDN
designator C?  Capacitance: 10nF  (hidden comment: *)
Capacitor, Ceramic (MLCC), 10nF, ±10%, 630V, X7R, ±10%, SMD 0805; Manufacturer: HUI JU; Manufacturer Part Number: NM0805B103K631CEDN; Package Size: 0805; JLCPCB Basic Part: No; JLCPCB Part Number: C780693; Supplier 1: LCSC; Category: Capacitors - MLCC; Supplier Part Number 1: C780693; Tolerance: ±10%; Voltage Rating: 630V; Temperature Coefficient: X7R; RoHS: Yes; ComponentLink1Description: Datasheet; ComponentLink1URL: https://wmsc.lcsc.com/wmsc/upload/file/pdf/v2/lcsc/2304140030_HUI-JU-NM0805B103K631CEDN_C780693.pdf; ComponentLink2Description: JLCPCB Part URL; ComponentLink2URL: https://jlcpcb.com/partdetail/C780693; ComponentLink3Description: LCSC Part URL; ComponentLink3URL: https://lcsc.com/product-detail/Multilayer-Ceramic-Capacitors-MLCC---SMD-SMT_HUI-JU-HUI-JU-NM0805B103K631CEDN_C780693.html
footprint CAP-0805 (0805 (2012M) Capacitor)
pins: 1, 2

## NM0805B104K101CEDN
designator C?  Capacitance: 100nF  (hidden comment: *)
Capacitor, Ceramic (MLCC), 100nF, ±10%, 100V, X7R, ±10%, SMD 0805; Manufacturer: HUI JU; Manufacturer Part Number: NM0805B104K101CEDN; Package Size: 0805; JLCPCB Basic Part: No; JLCPCB Part Number: C710457; Supplier 1: LCSC; Category: Capacitors - MLCC; Supplier Part Number 1: C710457; Tolerance: ±10%; Voltage Rating: 100V; Temperature Coefficient: X7R; RoHS: Yes; ComponentLink1Description: Datasheet; ComponentLink1URL: https://wmsc.lcsc.com/wmsc/upload/file/pdf/v2/lcsc/2304140030_HUI-JU-NM0805B104K101CEDN_C710457.pdf; ComponentLink2Description: JLCPCB Part URL; ComponentLink2URL: https://jlcpcb.com/partdetail/C710457; ComponentLink3Description: LCSC Part URL; ComponentLink3URL: https://lcsc.com/product-detail/Multilayer-Ceramic-Capacitors-MLCC---SMD-SMT_HUI-JU-HUI-JU-NM0805B104K101CEDN_C710457.html
footprint CAP-0805 (0805 (2012M) Capacitor)
pins: 1, 2

## NM0805B104K251CEDN
designator C?  Capacitance: 100nF  (hidden comment: *)
Capacitor, Ceramic (MLCC), 100nF, ±10%, 250V, X7R, ±10%, SMD 0805; Manufacturer: HUI JU; Manufacturer Part Number: NM0805B104K251CEDN; Package Size: 0805; JLCPCB Basic Part: No; JLCPCB Part Number: C710458; Supplier 1: LCSC; Category: Capacitors - MLCC; Supplier Part Number 1: C710458; Tolerance: ±10%; Voltage Rating: 250V; Temperature Coefficient: X7R; RoHS: Yes; ComponentLink1Description: Datasheet; ComponentLink1URL: https://wmsc.lcsc.com/wmsc/upload/file/pdf/v2/lcsc/2304140030_HUI-JU-NM0805B104K251CEDN_C710458.pdf; ComponentLink2Description: JLCPCB Part URL; ComponentLink2URL: https://jlcpcb.com/partdetail/C710458; ComponentLink3Description: LCSC Part URL; ComponentLink3URL: https://lcsc.com/product-detail/Multilayer-Ceramic-Capacitors-MLCC---SMD-SMT_HUI-JU-HUI-JU-NM0805B104K251CEDN_C710458.html
footprint CAP-0805 (0805 (2012M) Capacitor)
pins: 1, 2

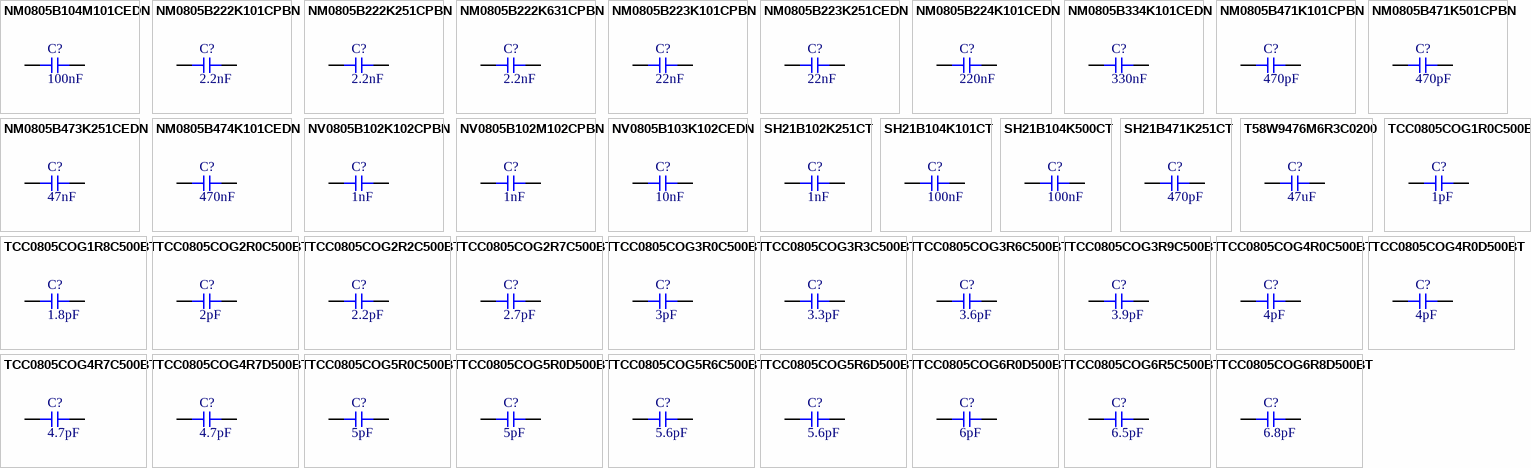
[diagram p73: symbols NM0805B104M101CEDN to TCC0805COG6R8D500BT]

## NM0805B104M101CEDN
designator C?  Capacitance: 100nF  (hidden comment: *)
Capacitor, Ceramic (MLCC), 100nF, ±20%, 100V, X7R, ±20%, SMD 0805; Manufacturer: HUI JU; Manufacturer Part Number: NM0805B104M101CEDN; Package Size: 0805; JLCPCB Basic Part: No; JLCPCB Part Number: C840116; Supplier 1: LCSC; Category: Capacitors - MLCC; Supplier Part Number 1: C840116; Tolerance: ±20%; Voltage Rating: 100V; Temperature Coefficient: X7R; RoHS: Yes; ComponentLink1Description: Datasheet; ComponentLink1URL: https://wmsc.lcsc.com/wmsc/upload/file/pdf/v2/lcsc/2304140030_HUI-JU-NM0805B104M101CEDN_C840116.pdf; ComponentLink2Description: JLCPCB Part URL; ComponentLink2URL: https://jlcpcb.com/partdetail/C840116; ComponentLink3Description: LCSC Part URL; ComponentLink3URL: https://lcsc.com/product-detail/Multilayer-Ceramic-Capacitors-MLCC---SMD-SMT_HUI-JU-HUI-JU-NM0805B104M101CEDN_C840116.html
footprint CAP-0805 (0805 (2012M) Capacitor)
pins: 1, 2

## NM0805B222K101CPBN
designator C?  Capacitance: 2.2nF  (hidden comment: *)
Capacitor, Ceramic (MLCC), 2.2nF, ±10%, 100V, ±10%, SMD 0805; Manufacturer: HUI JU; Manufacturer Part Number: NM0805B222K101CPBN; Package Size: 0805; JLCPCB Basic Part: No; JLCPCB Part Number: C780694; Supplier 1: LCSC; Category: Capacitors - MLCC; Supplier Part Number 1: C780694; Tolerance: ±10%; Voltage Rating: 100V; RoHS: Yes; ComponentLink1Description: Datasheet; ComponentLink1URL: https://wmsc.lcsc.com/wmsc/upload/file/pdf/v2/lcsc/2304140030_HUI-JU-NM0805B222K101CPBN_C780694.pdf; ComponentLink2Description: JLCPCB Part URL; ComponentLink2URL: https://jlcpcb.com/partdetail/C780694; ComponentLink3Description: LCSC Part URL; ComponentLink3URL: https://lcsc.com/product-detail/Multilayer-Ceramic-Capacitors-MLCC---SMD-SMT_HUI-JU-HUI-JU-NM0805B222K101CPBN_C780694.html
footprint CAP-0805 (0805 (2012M) Capacitor)
pins: 1, 2

## NM0805B222K251CPBN
designator C?  Capacitance: 2.2nF  (hidden comment: *)
Capacitor, Ceramic (MLCC), 2.2nF, ±10%, 250V, X7R, ±10%, SMD 0805; Manufacturer: HUI JU; Manufacturer Part Number: NM0805B222K251CPBN; Package Size: 0805; JLCPCB Basic Part: No; JLCPCB Part Number: C780695; Supplier 1: LCSC; Category: Capacitors - MLCC; Supplier Part Number 1: C780695; Tolerance: ±10%; Voltage Rating: 250V; Temperature Coefficient: X7R; RoHS: Yes; ComponentLink1Description: Datasheet; ComponentLink1URL: https://wmsc.lcsc.com/wmsc/upload/file/pdf/v2/lcsc/2304140030_HUI-JU-NM0805B222K251CPBN_C780695.pdf; ComponentLink2Description: JLCPCB Part URL; ComponentLink2URL: https://jlcpcb.com/partdetail/C780695; ComponentLink3Description: LCSC Part URL; ComponentLink3URL: https://lcsc.com/product-detail/Multilayer-Ceramic-Capacitors-MLCC---SMD-SMT_HUI-JU-HUI-JU-NM0805B222K251CPBN_C780695.html
footprint CAP-0805 (0805 (2012M) Capacitor)
pins: 1, 2

## NM0805B222K631CPBN
designator C?  Capacitance: 2.2nF  (hidden comment: *)
Capacitor, Ceramic (MLCC), 2.2nF, ±10%, 630V, ±10%, SMD 0805; Manufacturer: HUI JU; Manufacturer Part Number: NM0805B222K631CPBN; Package Size: 0805; JLCPCB Basic Part: No; JLCPCB Part Number: C780696; Supplier 1: LCSC; Category: Capacitors - MLCC; Supplier Part Number 1: C780696; Tolerance: ±10%; Voltage Rating: 630V; RoHS: Yes; ComponentLink1Description: Datasheet; ComponentLink1URL: https://wmsc.lcsc.com/wmsc/upload/file/pdf/v2/lcsc/2304140030_HUI-JU-NM0805B222K631CPBN_C780696.pdf; ComponentLink2Description: JLCPCB Part URL; ComponentLink2URL: https://jlcpcb.com/partdetail/C780696; ComponentLink3Description: LCSC Part URL; ComponentLink3URL: https://lcsc.com/product-detail/Multilayer-Ceramic-Capacitors-MLCC---SMD-SMT_HUI-JU-HUI-JU-NM0805B222K631CPBN_C780696.html
footprint CAP-0805 (0805 (2012M) Capacitor)
pins: 1, 2

## NM0805B223K101CPBN
designator C?  Capacitance: 22nF  (hidden comment: *)
Capacitor, Ceramic (MLCC), 22nF, ±10%, 100V, X7R, ±10%, SMD 0805; Manufacturer: HUI JU; Manufacturer Part Number: NM0805B223K101CPBN; Package Size: 0805; JLCPCB Basic Part: No; JLCPCB Part Number: C710460; Supplier 1: LCSC; Category: Capacitors - MLCC; Supplier Part Number 1: C710460; Tolerance: ±10%; Voltage Rating: 100V; Temperature Coefficient: X7R; RoHS: Yes; ComponentLink1Description: Datasheet; ComponentLink1URL: https://wmsc.lcsc.com/wmsc/upload/file/pdf/v2/lcsc/2304140030_HUI-JU-NM0805B223K101CPBN_C710460.pdf; ComponentLink2Description: JLCPCB Part URL; ComponentLink2URL: https://jlcpcb.com/partdetail/C710460; ComponentLink3Description: LCSC Part URL; ComponentLink3URL: https://lcsc.com/product-detail/Multilayer-Ceramic-Capacitors-MLCC---SMD-SMT_HUI-JU-HUI-JU-NM0805B223K101CPBN_C710460.html
footprint CAP-0805 (0805 (2012M) Capacitor)
pins: 1, 2

## NM0805B223K251CEDN
designator C?  Capacitance: 22nF  (hidden comment: *)
Capacitor, Ceramic (MLCC), 22nF, ±10%, 250V, X7R, ±10%, SMD 0805; Manufacturer: HUI JU; Manufacturer Part Number: NM0805B223K251CEDN; Package Size: 0805; JLCPCB Basic Part: No; JLCPCB Part Number: C717015; Supplier 1: LCSC; Category: Capacitors - MLCC; Supplier Part Number 1: C717015; Tolerance: ±10%; Voltage Rating: 250V; Temperature Coefficient: X7R; RoHS: Yes; ComponentLink1Description: Datasheet; ComponentLink1URL: https://wmsc.lcsc.com/wmsc/upload/file/pdf/v2/lcsc/2304140030_HUI-JU-NM0805B223K251CEDN_C717015.pdf; ComponentLink2Description: JLCPCB Part URL; ComponentLink2URL: https://jlcpcb.com/partdetail/C717015; ComponentLink3Description: LCSC Part URL; ComponentLink3URL: https://lcsc.com/product-detail/Multilayer-Ceramic-Capacitors-MLCC---SMD-SMT_HUI-JU-HUI-JU-NM0805B223K251CEDN_C717015.html
footprint CAP-0805 (0805 (2012M) Capacitor)
pins: 1, 2

## NM0805B224K101CEDN
designator C?  Capacitance: 220nF  (hidden comment: *)
Capacitor, Ceramic (MLCC), 220nF, ±10%, 100V, X7R, ±10%, SMD 0805; Manufacturer: HUI JU; Manufacturer Part Number: NM0805B224K101CEDN; Package Size: 0805; JLCPCB Basic Part: No; JLCPCB Part Number: C780700; Supplier 1: LCSC; Category: Capacitors - MLCC; Supplier Part Number 1: C780700; Tolerance: ±10%; Voltage Rating: 100V; Temperature Coefficient: X7R; RoHS: Yes; ComponentLink1Description: Datasheet; ComponentLink1URL: https://wmsc.lcsc.com/wmsc/upload/file/pdf/v2/lcsc/2304140030_HUI-JU-NM0805B224K101CEDN_C780700.pdf; ComponentLink2Description: JLCPCB Part URL; ComponentLink2URL: https://jlcpcb.com/partdetail/C780700; ComponentLink3Description: LCSC Part URL; ComponentLink3URL: https://lcsc.com/product-detail/Multilayer-Ceramic-Capacitors-MLCC---SMD-SMT_HUI-JU-HUI-JU-NM0805B224K101CEDN_C780700.html
footprint CAP-0805 (0805 (2012M) Capacitor)
pins: 1, 2

## NM0805B334K101CEDN
designator C?  Capacitance: 330nF  (hidden comment: *)
Capacitor, Ceramic (MLCC), 330nF, ±10%, 100V, X7R, ±10%, SMD 0805; Manufacturer: HUI JU; Manufacturer Part Number: NM0805B334K101CEDN; Package Size: 0805; JLCPCB Basic Part: No; JLCPCB Part Number: C840117; Supplier 1: LCSC; Category: Capacitors - MLCC; Supplier Part Number 1: C840117; Tolerance: ±10%; Voltage Rating: 100V; Temperature Coefficient: X7R; RoHS: Yes; ComponentLink1Description: Datasheet; ComponentLink1URL: https://wmsc.lcsc.com/wmsc/upload/file/pdf/v2/lcsc/2304140030_HUI-JU-NM0805B334K101CEDN_C840117.pdf; ComponentLink2Description: JLCPCB Part URL; ComponentLink2URL: https://jlcpcb.com/partdetail/C840117; ComponentLink3Description: LCSC Part URL; ComponentLink3URL: https://lcsc.com/product-detail/Multilayer-Ceramic-Capacitors-MLCC---SMD-SMT_HUI-JU-HUI-JU-NM0805B334K101CEDN_C840117.html
footprint CAP-0805 (0805 (2012M) Capacitor)
pins: 1, 2

## NM0805B471K101CPBN
designator C?  Capacitance: 470pF  (hidden comment: *)
Capacitor, Ceramic (MLCC), 470pF, ±10%, 100V, X7R, ±10%, SMD 0805; Manufacturer: HUI JU; Manufacturer Part Number: NM0805B471K101CPBN; Package Size: 0805; JLCPCB Basic Part: No; JLCPCB Part Number: C840118; Supplier 1: LCSC; Category: Capacitors - MLCC; Supplier Part Number 1: C840118; Tolerance: ±10%; Voltage Rating: 100V; Temperature Coefficient: X7R; RoHS: Yes; ComponentLink1Description: Datasheet; ComponentLink1URL: https://wmsc.lcsc.com/wmsc/upload/file/pdf/v2/lcsc/2304140030_HUI-JU-NM0805B471K101CPBN_C840118.pdf; ComponentLink2Description: JLCPCB Part URL; ComponentLink2URL: https://jlcpcb.com/partdetail/C840118; ComponentLink3Description: LCSC Part URL; ComponentLink3URL: https://lcsc.com/product-detail/Multilayer-Ceramic-Capacitors-MLCC---SMD-SMT_HUI-JU-HUI-JU-NM0805B471K101CPBN_C840118.html
footprint CAP-0805 (0805 (2012M) Capacitor)
pins: 1, 2

## NM0805B471K501CPBN
designator C?  Capacitance: 470pF  (hidden comment: *)
Capacitor, Ceramic (MLCC), 470pF, ±10%, 500V, X7R, ±10%, SMD 0805; Manufacturer: HUI JU; Manufacturer Part Number: NM0805B471K501CPBN; Package Size: 0805; JLCPCB Basic Part: No; JLCPCB Part Number: C710461; Supplier 1: LCSC; Category: Capacitors - MLCC; Supplier Part Number 1: C710461; Tolerance: ±10%; Voltage Rating: 500V; Temperature Coefficient: X7R; RoHS: Yes; ComponentLink1Description: Datasheet; ComponentLink1URL: https://wmsc.lcsc.com/wmsc/upload/file/pdf/v2/lcsc/2304140030_HUI-JU-NM0805B471K501CPBN_C710461.pdf; ComponentLink2Description: JLCPCB Part URL; ComponentLink2URL: https://jlcpcb.com/partdetail/C710461; ComponentLink3Description: LCSC Part URL; ComponentLink3URL: https://lcsc.com/product-detail/Multilayer-Ceramic-Capacitors-MLCC---SMD-SMT_HUI-JU-HUI-JU-NM0805B471K501CPBN_C710461.html
footprint CAP-0805 (0805 (2012M) Capacitor)
pins: 1, 2

## NM0805B473K251CEDN
designator C?  Capacitance: 47nF  (hidden comment: *)
Capacitor, Ceramic (MLCC), 47nF, ±10%, 250V, X7R, ±10%, SMD 0805; Manufacturer: HUI JU; Manufacturer Part Number: NM0805B473K251CEDN; Package Size: 0805; JLCPCB Basic Part: No; JLCPCB Part Number: C710462; Supplier 1: LCSC; Category: Capacitors - MLCC; Supplier Part Number 1: C710462; Tolerance: ±10%; Voltage Rating: 250V; Temperature Coefficient: X7R; RoHS: Yes; ComponentLink1Description: Datasheet; ComponentLink1URL: https://wmsc.lcsc.com/wmsc/upload/file/pdf/v2/lcsc/2304140030_HUI-JU-NM0805B473K251CEDN_C710462.pdf; ComponentLink2Description: JLCPCB Part URL; ComponentLink2URL: https://jlcpcb.com/partdetail/C710462; ComponentLink3Description: LCSC Part URL; ComponentLink3URL: https://lcsc.com/product-detail/Multilayer-Ceramic-Capacitors-MLCC---SMD-SMT_HUI-JU-HUI-JU-NM0805B473K251CEDN_C710462.html
footprint CAP-0805 (0805 (2012M) Capacitor)
pins: 1, 2

## NM0805B474K101CEDN
designator C?  Capacitance: 470nF  (hidden comment: *)
Capacitor, Ceramic (MLCC), 470nF, ±10%, 100V, ±10%, SMD 0805; Manufacturer: HUI JU; Manufacturer Part Number: NM0805B474K101CEDN; Package Size: 0805; JLCPCB Basic Part: No; JLCPCB Part Number: C841547; Supplier 1: LCSC; Category: Capacitors - MLCC; Supplier Part Number 1: C841547; Tolerance: ±10%; Voltage Rating: 100V; RoHS: Yes; ComponentLink1Description: Datasheet; ComponentLink1URL: https://wmsc.lcsc.com/wmsc/upload/file/pdf/v2/lcsc/2304140030_HUI-JU-NM0805B474K101CEDN_C841547.pdf; ComponentLink2Description: JLCPCB Part URL; ComponentLink2URL: https://jlcpcb.com/partdetail/C841547; ComponentLink3Description: LCSC Part URL; ComponentLink3URL: https://lcsc.com/product-detail/Multilayer-Ceramic-Capacitors-MLCC---SMD-SMT_HUI-JU-HUI-JU-NM0805B474K101CEDN_C841547.html
footprint CAP-0805 (0805 (2012M) Capacitor)
pins: 1, 2

## NV0805B102K102CPBN
designator C?  Capacitance: 1nF  (hidden comment: *)
Capacitor, Ceramic (MLCC), 1nF, ±10%, 1kV, X7R, ±10%, SMD 0805; Manufacturer: HUI JU; Manufacturer Part Number: NV0805B102K102CPBN; Package Size: 0805; JLCPCB Basic Part: No; JLCPCB Part Number: C725798; Supplier 1: LCSC; Category: Capacitors - MLCC; Supplier Part Number 1: C725798; Tolerance: ±10%; Voltage Rating: 1kV; Temperature Coefficient: X7R; RoHS: Yes; ComponentLink1Description: Datasheet; ComponentLink1URL: https://wmsc.lcsc.com/wmsc/upload/file/pdf/v2/lcsc/2304140030_HUI-JU-NV0805B102K102CPBN_C725798.pdf; ComponentLink2Description: JLCPCB Part URL; ComponentLink2URL: https://jlcpcb.com/partdetail/C725798; ComponentLink3Description: LCSC Part URL; ComponentLink3URL: https://lcsc.com/product-detail/Multilayer-Ceramic-Capacitors-MLCC---SMD-SMT_HUI-JU-HUI-JU-NV0805B102K102CPBN_C725798.html
footprint CAP-0805 (0805 (2012M) Capacitor)
pins: 1, 2

## NV0805B102M102CPBN
designator C?  Capacitance: 1nF  (hidden comment: *)
Capacitor, Ceramic (MLCC), 1nF, ±20%, 1kV, ±20%, SMD 0805; Manufacturer: HUI JU; Manufacturer Part Number: NV0805B102M102CPBN; Package Size: 0805; JLCPCB Basic Part: No; JLCPCB Part Number: C2760339; Supplier 1: LCSC; Category: Capacitors - MLCC; Supplier Part Number 1: C2760339; Tolerance: ±20%; Voltage Rating: 1kV; RoHS: Yes; ComponentLink1Description: Datasheet; ComponentLink1URL: https://wmsc.lcsc.com/wmsc/upload/file/pdf/v2/lcsc/2304140030_HUI-JU-NV0805B102M102CPBN_C2760339.pdf; ComponentLink2Description: JLCPCB Part URL; ComponentLink2URL: https://jlcpcb.com/partdetail/C2760339; ComponentLink3Description: LCSC Part URL; ComponentLink3URL: https://lcsc.com/product-detail/Multilayer-Ceramic-Capacitors-MLCC---SMD-SMT_HUI-JU-HUI-JU-NV0805B102M102CPBN_C2760339.html
footprint CAP-0805 (0805 (2012M) Capacitor)
pins: 1, 2

## NV0805B103K102CEDN
designator C?  Capacitance: 10nF  (hidden comment: *)
Capacitor, Ceramic (MLCC), 10nF, 1kV, SMD 0805; Manufacturer: HUI JU; Manufacturer Part Number: NV0805B103K102CEDN; Package Size: 0805; JLCPCB Basic Part: No; JLCPCB Part Number: C2687150; Supplier 1: LCSC; Category: Capacitors - MLCC; Supplier Part Number 1: C2687150; Voltage Rating: 1kV; RoHS: Yes; ComponentLink1Description: Datasheet; ComponentLink1URL: https://wmsc.lcsc.com/wmsc/upload/file/pdf/v2/lcsc/2202131830_HUI-JU-NV0805B103K102CEDN_C2687150.pdf; ComponentLink2Description: JLCPCB Part URL; ComponentLink2URL: https://jlcpcb.com/partdetail/C2687150; ComponentLink3Description: LCSC Part URL; ComponentLink3URL: https://lcsc.com/product-detail/Multilayer-Ceramic-Capacitors-MLCC---SMD-SMT_HUI-JU-HUI-JU-NV0805B103K102CEDN_C2687150.html
footprint CAP-0805 (0805 (2012M) Capacitor)
pins: 1, 2

## SH21B102K251CT
designator C?  Capacitance: 1nF  (hidden comment: *)
Capacitor, Ceramic (MLCC), 1nF, ±10%, 250V, X7R, ±10%, SMD 0805; Manufacturer: Walsin Tech Corp; Manufacturer Part Number: SH21B102K251CT; Package Size: 0805; JLCPCB Basic Part: No; JLCPCB Part Number: C5122276; Supplier 1: LCSC; Category: Capacitors - MLCC; Supplier Part Number 1: C5122276; Tolerance: ±10%; Voltage Rating: 250V; Temperature Coefficient: X7R; RoHS: Yes; ComponentLink1Description: Datasheet; ComponentLink1URL: https://wmsc.lcsc.com/wmsc/upload/file/pdf/v2/lcsc/2208151830_Walsin-Tech-Corp-SH21B102K251CT_C5122276.pdf; ComponentLink2Description: JLCPCB Part URL; ComponentLink2URL: https://jlcpcb.com/partdetail/C5122276; ComponentLink3Description: LCSC Part URL; ComponentLink3URL: https://lcsc.com/product-detail/Multilayer-Ceramic-Capacitors-MLCC---SMD-SMT_Walsin-Tech-Corp-Walsin-Tech-Corp-SH21B102K251CT_C5122276.html
footprint CAP-0805 (0805 (2012M) Capacitor)
pins: 1, 2

## SH21B104K101CT
designator C?  Capacitance: 100nF  (hidden comment: *)
Capacitor, Ceramic (MLCC), 100nF, ±10%, 100V, X7R, ±10%, SMD 0805; Manufacturer: Walsin Tech Corp; Manufacturer Part Number: SH21B104K101CT; Package Size: 0805; JLCPCB Basic Part: No; JLCPCB Part Number: C384662; Supplier 1: LCSC; Category: Capacitors - MLCC; Supplier Part Number 1: C384662; Tolerance: ±10%; Voltage Rating: 100V; Temperature Coefficient: X7R; RoHS: Yes; ComponentLink1Description: Datasheet; ComponentLink1URL: https://wmsc.lcsc.com/wmsc/upload/file/pdf/v2/lcsc/2401181553_Walsin-Tech-Corp-SH21B104K101CT_C384662.pdf; ComponentLink2Description: JLCPCB Part URL; ComponentLink2URL: https://jlcpcb.com/partdetail/C384662; ComponentLink3Description: LCSC Part URL; ComponentLink3URL: https://lcsc.com/product-detail/Multilayer-Ceramic-Capacitors-MLCC---SMD-SMT_Walsin-Tech-Corp-Walsin-Tech-Corp-SH21B104K101CT_C384662.html
footprint CAP-0805 (0805 (2012M) Capacitor)
pins: 1, 2